# Altium integrated library Integrated_Library - 02.02.25 - 22.49.IntLib: 792 symbols (part 9 of 11) (continued)
## CMP-020-00005-3 (continued)
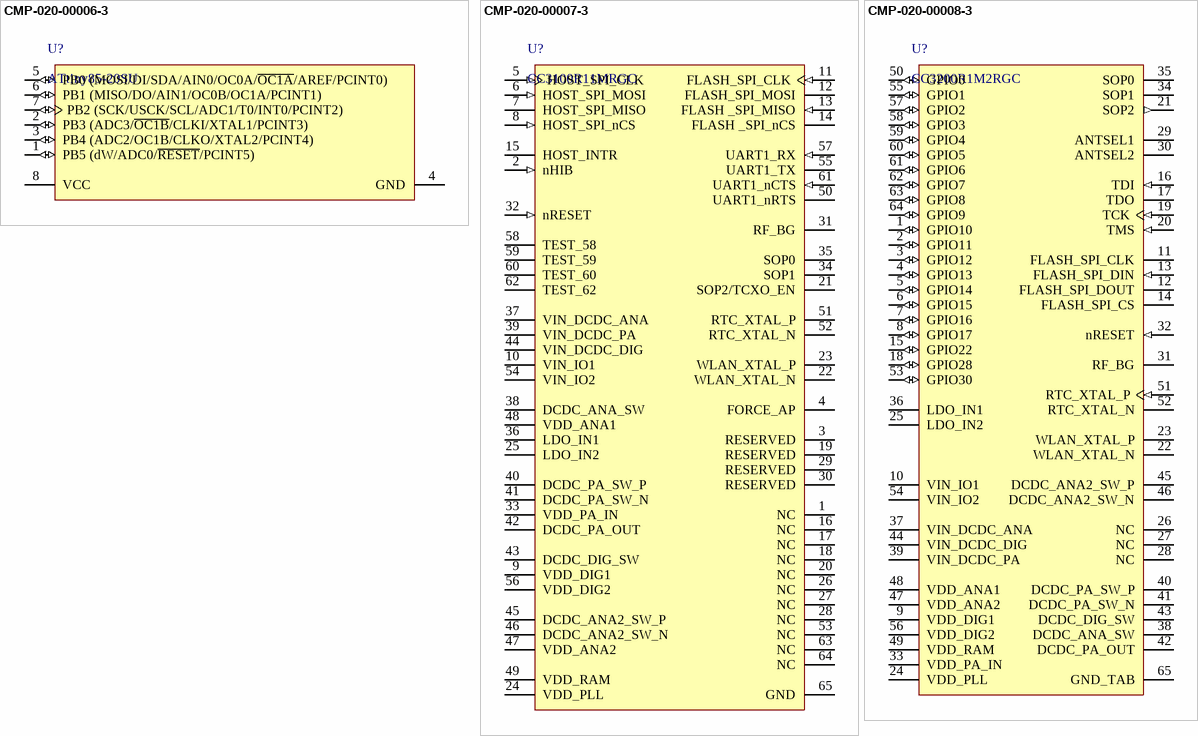
[diagram p21: symbols CMP-020-00006-3 to CMP-020-00008-3]

## CMP-020-00006-3
designator U?, comment ATtiny85-20SU
8-bit AVR Microcontroller with In-System Programmable Flash, 2.7 to 5.5 V, 20 MHz, 8 KB Flash, 0.5 KB EEPROM, 0.5 KB SRAM, -40 to 85 degC, 8-Pin SOIC (8S2), RoHS, Tube; Manufacturer: Atmel; ADC Channels: 4; Max Supply Voltage: 5.5V; PWM Channels: 6; UART Channels: 1; Interface: SPI; USB Channels: 0; Min Supply Voltage: 2.7V; Frequency: 20MHz; RAM Size: 512B; Density: 8KB; Datasheet Version: Rev. 2586Q, 08/2013; Package Quantity: 95; RoHS Compliant: True; Manufacturer URL: http://www.atmel.com/; Datasheet URL: http://www.atmel.com/Images/Atmel-2586-AVR-8-bit-Microcontroller-ATtiny25-ATtiny45-ATtiny85_Datasheet.pdf; Package Description: 8-Pin Small Outline Integrated Circuit Package, Body 5.29 x 5.24 mm, Pitch 1.27 mm; Mounting Technology: SM; Max Operating Temperature: 85°C; Case/Package: SOIC; I/Os: 6; Max Clock Frequency: 20MHz; Packaging: Rail/Tube; Min Operating Temperature: -40°C; Pins: 8; Package Reference: 8S2
footprint ATML-8S2_N (SOIC, 8-Leads, Body 5.4x5.4mm, Pitch 1.27mm, IPC Medium Density)
footprint ATML-8S2_M (SOIC, 8-Leads, Body 5.4x5.4mm, Pitch 1.27mm, IPC Low Density)
footprint ATML-8S2_L (SOIC, 8-Leads, Body 5.4x5.4mm, Pitch 1.27mm, IPC High Density)
pins: 1 PB5 (dW/ADC0/~{RESET}/PCINT5) (io), 2 PB3 (ADC3/~{OC1B}/CLKI/XTAL1/PCINT3) (io), 3 PB4 (ADC2/OC1B/CLKO/XTAL2/PCINT4) (io), 4 GND (power) "Ground.", 5 PB0 (MOSI/DI/SDA/AIN0/OC0A/~{OC1A}/AREF/PCINT0) (io), 6 PB1 (MISO/DO/AIN1/OC0B/OC1A/PCINT1) (io), 7 PB2 (SCK/USCK/SCL/ADC1/T0/INT0/PCINT2) (io), 8 VCC (power) "Supply voltage."

## CMP-020-00007-3
designator U?, comment CC3100R11MRGC
SimpleLink(TM) Wi-Fi(R) Network Processor, Internet-of-Things Solution for MCU Application, 2.1 to 3.6 V, -40 to 85 degC, 64-Pin VQFN (RGC), Green (RoHS & no Sb/Br), Tray; Manufacturer: Texas Instruments; Max Supply Voltage: 3.6V; Min Supply Voltage: 2.1V; RoHS Compliant: True; Datasheet URL: http://www.ti.com/lit/ds/symlink/cc3100.pdf; Datasheet Version: SWAS031D, 02/2015; Packaging: CutTape; Pins: 64; Case/Package: RGC0064H; Mounting Technology: SM; Package Reference: RGC0064H; Min Operating Temperature: -40°C; Package Description: 64-Pin Quad Flat No-lead Package, Body 9 x 9 mm, Pitch 0.5 mm, Thermal Pad 7.3 x7.3 mm; Max Operating Temperature: 85°C; Manufacturer URL: http://www.ti.com/
footprint RGC0064H_V (QFN, 64-Leads, Body 9x9mm, Pitch 0.5mm, Thermal Pad 7.4x7.4mm, TI Recommend)
pins: 1 NC "Unused; leave unconnected.", 2 nHIB (in) "Hibernate signal input to the NWP (active low). This is connected to the MCU GPIO. If the GPIO from the MCU can float while the MCU enters low power, consider adding a pull-up resistor on the board to avoid floating.", 3 RESERVED "Reserved for future use", 4 FORCE_AP "For forced AP mode, pull to high on the board using 100k resistor. Otherwise, pull down to ground using 100k resistor.(1)", 5 HOST_SPI_CLK (in) "Host interface SPI clock", 6 HOST_SPI_MOSI (in) "Host interface SPI data input", 7 HOST_SPI_MISO "Host interface SPI data output", 8 HOST_SPI_nCS (in) "Host interface SPI chip selec", 9 VDD_DIG1 (power) "Digital core supply", 10 VIN_IO1 (power) "I/O supply", 11 FLASH_SPI_CLK (in) "Serial flash interface: SPI clock", 12 FLASH_SPI_MOSI "Serial flash interface: SPI data out", 13 FLASH _SPI_MISO (in) "Serial flash interface: SPI data in", 14 FLASH _SPI_nCS "Serial flash interface: SPI chip select (active low)", 15 HOST_INTR (hiz) "Interrupt output (active high)", 16 NC "Unused; leave unconnected.", 17 NC "Unused; leave unconnected.", 18 NC "Unused; leave unconnected.", 19 RESERVED "Connect 100K pull-down to ground.", 20 NC "Unused; leave unconnected.", 21 SOP2/TCXO_EN "Enable signal for external TCXO. Add 10k pulldown to ground.", 22 WLAN_XTAL_N "Connect the WLAN 40-MHz XTAL here.", 23 WLAN_XTAL_P "Connect the WLAN 40-MHz XTAL here.", 24 VDD_PLL (power) "Internal PLL power supply (1.4 V nominal)", 25 LDO_IN2 (power) "Input to internal LDO", 26 NC "Unused; leave unconnected.", 27 NC "Unused; leave unconnected.", 28 NC "Unused; leave unconnected.", 29 RESERVED "Reserved for future use", 30 RESERVED "Reserved for future use", 31 RF_BG "2.4-GHz RF TX/RX", 32 nRESET (in) "RESET input for the device. Active low input. Use RC circuit (100k || 0.1 uF) for power on reset.", 33 VDD_PA_IN (power) "Power supply for the RF power amplifier (PA)", 34 SOP1 "Add 100K pulldown to ground.", 35 SOP0 "Add 100K pulldown to ground.", 36 LDO_IN1 (power) "Input to internal LDO", 37 VIN_DCDC_ANA (power) "Power supply for the DC-DC converter for analog section", 38 DCDC_ANA_SW (power) "Analog DC-DC converter switch output", 39 VIN_DCDC_PA (power) "PA DC-DC converter input supply", 40 DCDC_PA_SW_P (power) "PA DC-DC converter switch output +ve", 41 DCDC_PA_SW_N (power) "PA DC-DC converter switch output -ve", 42 DCDC_PA_OUT (power) "PA DC-DC converter output. Connect the output capacitor for DC-DC here.", 43 DCDC_DIG_SW (power) "Digital DC-DC converter switch output", 44 VIN_DCDC_DIG (power) "Power supply input for the digital DC-DC converter", 45 DCDC_ANA2_SW_P (power) "Analog2 DC-DC converter switch output +ve", 46 DCDC_ANA2_SW_N (power) "Analog2 DC-DC converter switch output -ve", 47 VDD_ANA2 (power) "Analog2 power supply input", 48 VDD_ANA1 (power) "Analog1 power supply input", 49 VDD_RAM (power) "Power supply for the internal RAM", 50 UART1_nRTS "UART host interface", 51 RTC_XTAL_P "32.768 kHz XTAL_P/external CMOS level clock input", 52 RTC_XTAL_N "32.768 kHz XTAL_N/100k external pullup for external clock", 53 NC "Unused. Leave unconnected.", 54 VIN_IO2 (power) "I/O power supply. Same as battery voltage.", 55 UART1_TX "UART host interface. Connect to test point on prototype for flash programming.", 56 VDD_DIG2 (power) "Digital power supply (1.2 V)", 57 UART1_RX (in) "UART host interface. Connect to test point on prototype for flash programming.", 58 TEST_58 "Test signal. Connect to an external test point", 59 TEST_59 "Test signal. Connect to an external test point.", 60 TEST_60 "Test signal. Connect to an external test point.", 61 UART1_nCTS (in) "UART host interface", 62 TEST_62 "Test signal. Connect to an external test point.", 63 NC "Leave unconnected", 64 NC "Leave unconnected", 65 GND (power) "Ground tab used as thermal and electrical ground"

## CMP-020-00008-3
designator U?, comment CC3200R1M2RGC
SimpleLink Wi-Fi and Internet-of-Things Solution, A Single-Chip Wireless MCU, 2.1 to 3.6 V, -40 to 85 degC, 64-Pin PQFN (RGC64), Green (RoHS & no Sb/Br), Tray; Manufacturer: Texas Instruments; RAM Size: 256KB; Min Operating Temperature: -40°C; Manufacturer URL: http://www.ti.com/; RoHS Compliant: True; Datasheet URL: http://www.ti.com/lit/ds/symlink/cc3200.pdf; Max Operating Temperature: 85°C; Package URL: http://www.ti.com/lit/ml/mpqf125e/mpqf125e.pdf; Case/Package: RGC64; Package Reference: RGC64; Datasheet Version: SWAS032F, 02/2015; Packaging: Tray
footprint TI-RGC64-7300x7300TP_L (QFN, 64-Leads, Body 9.15x9.15mm, Pitch 0.50mm, Thermal Pad 7.30x7.30mm, IPC High Density)
footprint TI-RGC64-7300x7300TP_M (QFN, 64-Leads, Body 9.15x9.15mm, Pitch 0.50mm, Thermal Pad 7.30x7.30mm, IPC Low Density)
footprint TI-RGC64-7300x7300TP_N (QFN, 64-Leads, Body 9.15x9.15mm, Pitch 0.50mm, Thermal Pad 7.30x7.30mm, IPC Medium Density)
pins: 1 GPIO10 (io) "General-Purpose  I/O", 2 GPIO11 (io) "General-Purpose  I/O", 3 GPIO12 (io) "General Purpose  I/O", 4 GPIO13 (io) "General Purpose  I/O", 5 GPIO14 (io) "General Purpose  I/O", 6 GPIO15 (io) "General Purpose  I/O", 7 GPIO16 (io) "General Purpose  I/O", 8 GPIO17 (io) "General Purpose  I/O", 9 VDD_DIG1 (power) "Internal Digital Core Voltage", 10 VIN_IO1 (power) "Chip Supply  Voltage (VBAT)", 11 FLASH_SPI_CLK (hiz) "Clock To SPI  Serial Flash  (Fixed Default)", 12 FLASH_SPI_DOUT (hiz) "Data To SPI  Serial Flash  (Fixed Default)", 13 FLASH_SPI_DIN (in) "Data From SPI  Serial Flash  (Fixed Default)", 14 FLASH_SPI_CS (hiz) "Chip Select To  SPI Serial Flash  (Fixed Default)", 15 GPIO22 (io) "General Purpose  I/O", 16 TDI (in) "JTAG TDI. Reset  Default Pinout.", 17 TDO (hiz) "JTAG TDO.  Reset Default  Pinout.", 18 GPIO28 (io) "General Purpose  I/O", 19 TCK (in) "JTAG/SWD TCK  Reset Default  Pinout", 20 TMS (in) "JATG/SWD TMS  Reset Default  Pinout", 21 SOP2 (out) "Sense-On-Power  2", 22 WLAN_XTAL_N "40-MHz XTAL  Pulldown if ext TCXO is used.", 23 WLAN_XTAL_P "40-MHz XTAL or  TCXO clock input", 24 VDD_PLL (power) "Internal analog voltage", 25 LDO_IN2 (power) "Analog RF  supply from ANA  DC-DC output", 26 NC "Reserved", 27 NC "Reserved", 28 NC "Reserved", 29 ANTSEL1 (hiz) "Antenna  Selection Control", 30 ANTSEL2 (hiz) "Antenna  Selection Control", 31 RF_BG "RF BG band", 32 nRESET (in) "Master chip  reset. Active low.", 33 VDD_PA_IN (power) "PA supply  voltage from PA  DC-DC output.", 34 SOP1 "Sense On Power  1", 35 SOP0 "Sense On Power  0", 36 LDO_IN1 (power) "Analog RF  supply from ana DC-DC output", 37 VIN_DCDC_ANA (power) "Analog DC-DC  input (connected  to chip input  supply [VBAT])", 38 DCDC_ANA_SW (power) "Analog DC-DC  switching node.", 39 VIN_DCDC_PA (power) "PA DC-DC input  (connected to  chip input supply  [VBAT])", 40 DCDC_PA_SW_P (power) "PA DCDC  switching node", 41 DCDC_PA_SW_N (power) "PA DCDC  switching node", 42 DCDC_PA_OUT (power) "PA buck  converter output", 43 DCDC_DIG_SW (power) "DIG DC-DC  switching node", 44 VIN_DCDC_DIG (power) "DIG DC-DC input  (connected to  chip input supply  [VBAT])", 45 DCDC_ANA2_SW_P "ANA2 DCDC  Converter +ve  Switching Node.", 46 DCDC_ANA2_SW_N "ANA2 DCDC  Converter -ve Switching Node.", 47 VDD_ANA2 (power) "ANA2 DCDC O", 48 VDD_ANA1 (power) "Analog supply  fed by ANA2 DCDC output", 49 VDD_RAM (power) "SRAM LDO  output", 50 GPIO0 (io) "General-Purpose  I/O", 51 RTC_XTAL_P (in) "Connect 32.768-  kHz XTAL or  Froce external CMOS level  clock", 52 RTC_XTAL_N "Connect 32.768-  kHz XTAL or connect a 100 kohm  to Vsupply.", 53 GPIO30 (io) "General-Purpose  I/O", 54 VIN_IO2 (power) "Chip Supply  Voltage (VBAT)", 55 GPIO1 (io) "General-Purpose  I/O", 56 VDD_DIG2 (power) "Internal Digital  Core Voltage", 57 GPIO2 (io) "General-Purpose  I/O", 58 GPIO3 (io) "General-Purpose  I/O", 59 GPIO4 (io) "General-Purpose  I/O", 60 GPIO5 (io) "General-Purpose  I/O", 61 GPIO6 (io) "General-Purpose  I/O", 62 GPIO7 (io) "General-Purpose  I/O", 63 GPIO8 (io) "General-Purpose  I/O", 64 GPIO9 (io) "General-Purpose  I/O", 65 GND_TAB (power) "Thermal pad and  electrical ground"

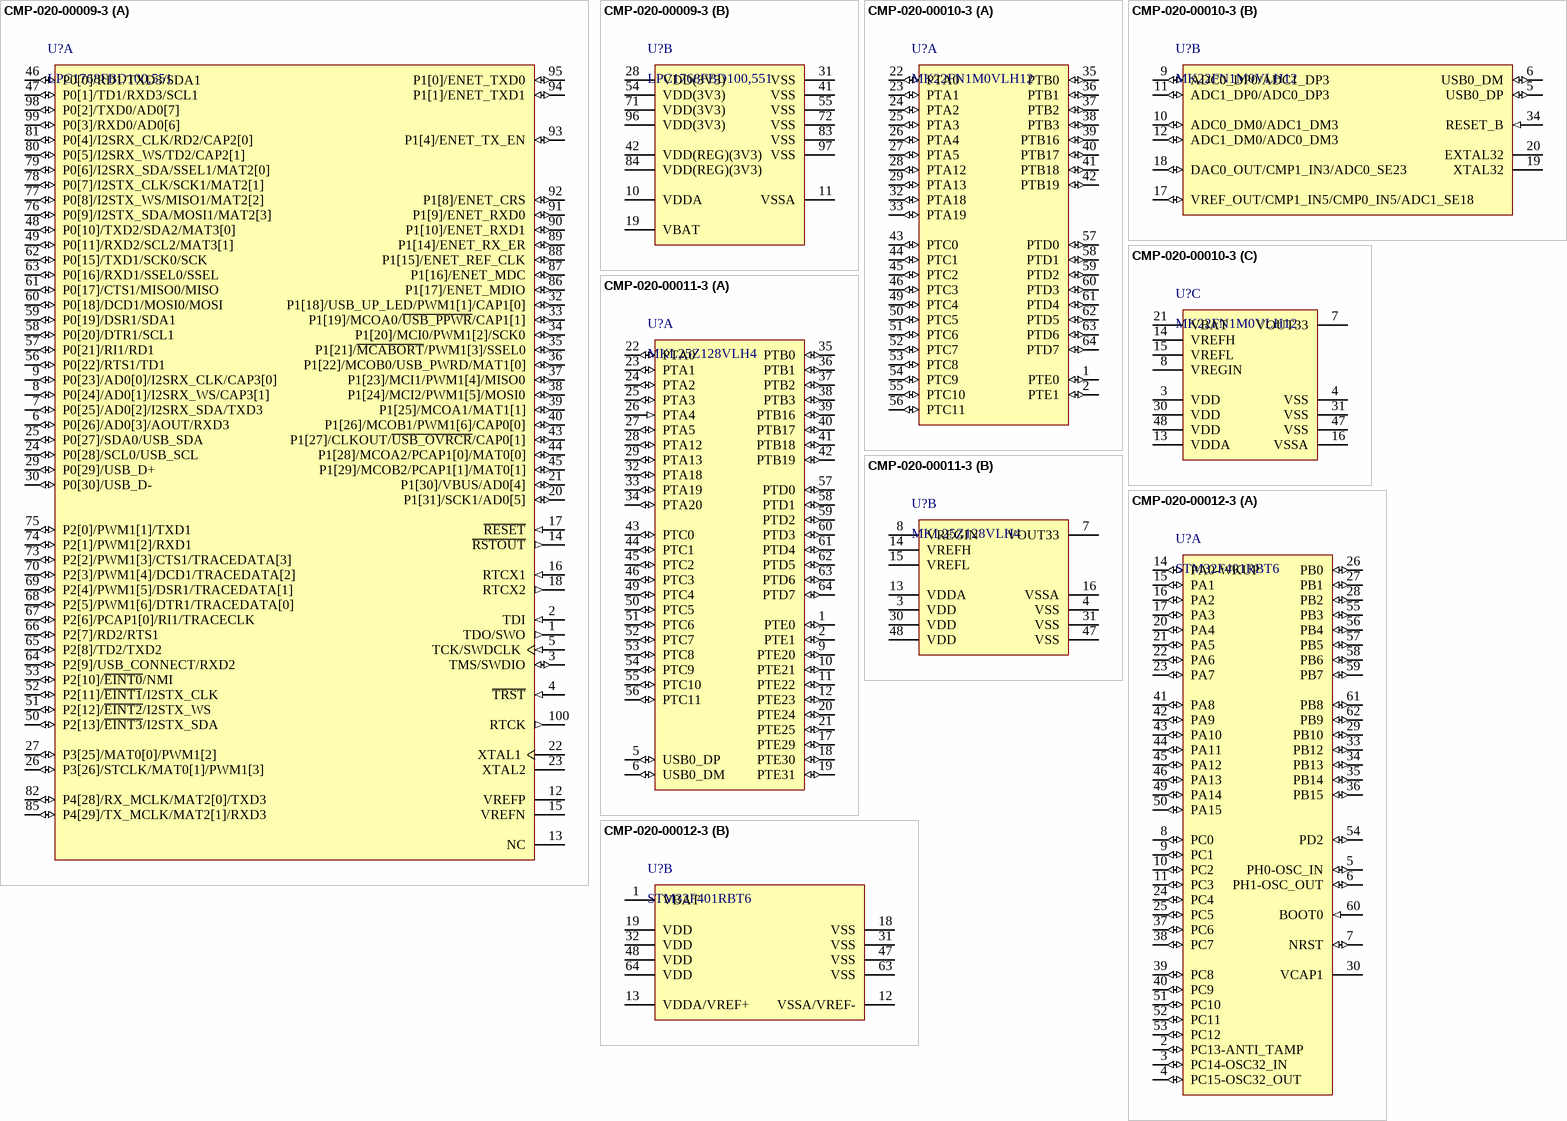
[diagram p22: symbols CMP-020-00009-3 to CMP-020-00012-3]

## CMP-020-00009-3
designator U?, comment LPC1768FBD100,551
32-Bit ARM Cortex-M3 Microcontroller, Ethernet, USB 2.0 Host/Device/OTG, CAN, 512 KB Flash, 64 KB SRAM, -40 to 85 degC, 100-Pin LQFP (SOT407-1), RoHS, Tray; Manufacturer: NXP; Density: 512KB; PWM Channels: 7; I/Os: 70; Frequency: 100MHz; Power: 1.5W; RAM Size: 64KB; Min Supply Voltage: 2.4V; UART Channels: 4; Max Supply Voltage: 3.6V; Nominal Supply Voltage: 3.3V; ADC Channels: 8; Ethernet Channels: 1; Interface: UART; Package Reference: SOT407-1; Datasheet URL: http://www.nxp.com/documents/data_sheet/LPC1769_68_67_66_65_64_63.pdf; Case/Package: LQFP; RoHS Compliant: True; Package Quantity: 90; Max Clock Frequency: 100MHz; Package URL: http://www.nxp.com/documents/; Pins: 100; Package Description: 100-Pin Plastic Low Profile Quad Flat Package, Body 14 x 14 mm; Mounting Technology: SM; Datasheet Version: Rev. 9.6 , 08/2015; Manufacturer URL: http://www.nxp.com/; Min Operating Temperature: -40°C; Max Operating Temperature: 85°C; Packaging: Tray
footprint NXP-SOT407-1_V (QFP, 100-Leads, Body 14x14mm)
part A pins: 1 TDO/SWO (out), 2 TDI (in), 3 TMS/SWDIO (io), 4 ~{TRST} (in), 5 TCK/SWDCLK (in), 6 P0[26]/AD0[3]/AOUT/RXD3 (io), 7 P0[25]/AD0[2]/I2SRX_SDA/TXD3 (io), 8 P0[24]/AD0[1]/I2SRX_WS/CAP3[1] (io), 9 P0[23]/AD0[0]/I2SRX_CLK/CAP3[0] (io), 12 VREFP, 13 NC, 14 ~{RSTOUT} (out), 15 VREFN, 16 RTCX1 (in), 17 ~{RESET} (in), 18 RTCX2 (out), 20 P1[31]/SCK1/AD0[5] (io), 21 P1[30]/VBUS/AD0[4] (io), 22 XTAL1, 23 XTAL2, 24 P0[28]/SCL0/USB_SCL (io), 25 P0[27]/SDA0/USB_SDA (io), 26 P3[26]/STCLK/MAT0[1]/PWM1[3] (io), 27 P3[25]/MAT0[0]/PWM1[2] (io), 29 P0[29]/USB_D+ (io), 30 P0[30]/USB_D- (io), 32 P1[18]/USB_UP_LED/PWM1[1]/CAP1[0] (io), 33 P1[19]/MCOA0/~{USB_PPWR}/CAP1[1] (io), 34 P1[20]/MCI0/PWM1[2]/SCK0 (io), 35 P1[21]/~{MCABORT}/PWM1[3]/SSEL0 (io), 36 P1[22]/MCOB0/USB_PWRD/MAT1[0] (io), 37 P1[23]/MCI1/PWM1[4]/MISO0 (io), 38 P1[24]/MCI2/PWM1[5]/MOSI0 (io), 39 P1[25]/MCOA1/MAT1[1] (io), 40 P1[26]/MCOB1/PWM1[6]/CAP0[0] (io), 43 P1[27]/CLKOUT/~{USB_OVRCR}/CAP0[1] (io), 44 P1[28]/MCOA2/PCAP1[0]/MAT0[0] (io), 45 P1[29]/MCOB2/PCAP1[1]/MAT0[1] (io), 46 P0[0]/RD1/TXD3/SDA1 (io), 47 P0[1]/TD1/RXD3/SCL1 (io), 48 P0[10]/TXD2/SDA2/MAT3[0] (io), 49 P0[11]/RXD2/SCL2/MAT3[1] (io), 50 P2[13]/~{EINT3}/I2STX_SDA (io), 51 P2[12]/~{EINT2}/I2STX_WS (io), 52 P2[11]/~{EINT1}/I2STX_CLK (io), 53 P2[10]/~{EINT0}/NMI (io), 56 P0[22]/RTS1/TD1 (io), 57 P0[21]/RI1/RD1 (io), 58 P0[20]/DTR1/SCL1 (io), 59 P0[19]/DSR1/SDA1 (io), 60 P0[18]/DCD1/MOSI0/MOSI (io), 61 P0[17]/CTS1/MISO0/MISO (io), 62 P0[15]/TXD1/SCK0/SCK (io), 63 P0[16]/RXD1/SSEL0/SSEL (io), 64 P2[9]/USB_CONNECT/RXD2 (io), 65 P2[8]/TD2/TXD2 (io), 66 P2[7]/RD2/RTS1 (io), 67 P2[6]/PCAP1[0]/RI1/TRACECLK (io), 68 P2[5]/PWM1[6]/DTR1/TRACEDATA[0] (io), 69 P2[4]/PWM1[5]/DSR1/TRACEDATA[1] (io), 70 P2[3]/PWM1[4]/DCD1/TRACEDATA[2] (io), 73 P2[2]/PWM1[3]/CTS1/TRACEDATA[3] (io), 74 P2[1]/PWM1[2]/RXD1 (io), 75 P2[0]/PWM1[1]/TXD1 (io), 76 P0[9]/I2STX_SDA/MOSI1/MAT2[3] (io), 77 P0[8]/I2STX_WS/MISO1/MAT2[2] (io), 78 P0[7]/I2STX_CLK/SCK1/MAT2[1] (io), 79 P0[6]/I2SRX_SDA/SSEL1/MAT2[0] (io), 80 P0[5]/I2SRX_WS/TD2/CAP2[1] (io), 81 P0[4]/I2SRX_CLK/RD2/CAP2[0] (io), 82 P4[28]/RX_MCLK/MAT2[0]/TXD3 (io), 85 P4[29]/TX_MCLK/MAT2[1]/RXD3 (io), 86 P1[17]/ENET_MDIO (io), 87 P1[16]/ENET_MDC (io), 88 P1[15]/ENET_REF_CLK (io), 89 P1[14]/ENET_RX_ER (io), 90 P1[10]/ENET_RXD1 (io), 91 P1[9]/ENET_RXD0 (io), 92 P1[8]/ENET_CRS (io), 93 P1[4]/ENET_TX_EN (io), 94 P1[1]/ENET_TXD1 (io), 95 P1[0]/ENET_TXD0 (io), 98 P0[2]/TXD0/AD0[7] (io), 99 P0[3]/RXD0/AD0[6] (io), 100 RTCK (out)
part B pins: 10 VDDA (power), 11 VSSA (power), 19 VBAT (power), 28 VDD(3V3) (power), 31 VSS (power), 41 VSS (power), 42 VDD(REG)(3V3) (power), 54 VDD(3V3) (power), 55 VSS (power), 71 VDD(3V3) (power), 72 VSS (power), 83 VSS (power), 84 VDD(REG)(3V3) (power), 96 VDD(3V3) (power), 97 VSS (power)

## CMP-020-00010-3
designator U?, comment MK22FN1M0VLH12
Kinetis K22F Sub-Family, 120 MHz ARM(R) Cortex(R)-M4-based Microcontroller with FPU, 1.71 to 3.6 V, -40 to 105 degC, 64-Pin LQFP, RoHS, Tray; Manufacturer: Freescale; Max Supply Voltage: 3.6V; Density: 1MB; Package Version: Rev. G, 01/2016; RAM Size: 128KB; Max Clock Frequency: 120MHz; Interface: UART; Min Supply Voltage: 1.71V; Datasheet Version: Rev. 4, 11/2014; Package Quantity: 160; Package Reference: LQFP-64; Package Description: 64-Pin Low-profile Quad Flat Package, Body 10 x 10 mm, Pitch 0.5 mm; Mounting Technology: SM; Max Operating Temperature: 105°C; Datasheet URL: http://cache.nxp.com/files/32bit/doc/data_sheet/K22P64M120SF5.pdf; Min Operating Temperature: -40°C; RoHS Compliant: True; Case/Package: LQFP; Packaging: Tray; Package URL: http://cache.nxp.com/files/shared/doc/package_info/98ASS23234W.pdf?fsrch=1&sr=1&pageNum=1; Manufacturer URL: http://www.nxp.com/; Pins: 64
footprint FREE-LQFP-64_L (TSQFP, 64-Leads, Body 10.00x10.00mm, Pitch 0.50mm, IPC High Density)
footprint FREE-LQFP-64_N (TSQFP, 64-Leads, Body 10.00x10.00mm, Pitch 0.50mm, IPC Medium Density)
footprint FREE-LQFP-64_M (TSQFP, 64-Leads, Body 10.00x10.00mm, Pitch 0.50mm, IPC Low Density)
part A pins: 1 PTE0 (io) "ADC1_SE4A/UART1_TX/TRACE_CLKOUT/I2C1_SDA/RTC_CLKOUT", 2 PTE1 (io) "LLWU_P0/ADC1_SE5A/UART1_RX/TRACE_D3/I2C1_SCL", 22 PTA0 (io) "UART0_CTS_B/FTM0_CH5/JTAG_TCLK/SWD_CLK/EZP_CLK", 23 PTA1 (io) "UART0_RX/FTM0_CH6/JTAG_TDI/EZP_DI", 24 PTA2 (io) "UART0_TX/FTM0_CH7/JTAG_TDO/TRACE_SWO/EZP_DO", 25 PTA3 (io) "UART0_RTS_B/FTM0_CH0/JTAG_TMS/SWD_DIO", 26 PTA4 (io) "LLWU_P3/FTM0_CH1/NMI_B/EZP_CS_B", 27 PTA5 (io) "USB_CLKIN/FTM0_CH2/CMP2_OUT/2S0_TX_BCLK/JTAG_TRST_B", 28 PTA12 (io) "CMP2_IN0/CAN0_TX/FTM1_CH0/I2C2_SCL/I2S0_TXD0/FTM1_QD_PHA", 29 PTA13 (io) "LLWU_P4/CMP2_IN1/CAN0_RX/FTM1_CH1/I2C2_SDA/I2S0_TX_FS/FTM1_QD_PHB", 32 PTA18 (io) "EXTAL0/FTM0_FLT2/FTM_CLKIN0", 33 PTA19 (io) "XTAL0/FTM1_FLT0/FTM_CLKIN1/LPTMR0_ALT1", 35 PTB0 (io) "LLWU_P5/ADC0_SE8/ADC1_SE8/I2C0_SCL/FTM1_CH0/FTM1_QD_PHA", 36 PTB1 (io) "ADC0_SE9/ADC1_SE9/PTB1/I2C0_SDA/FTM1_CH1/FTM1_QD_PHB", 37 PTB2 (io) "ADC0_SE12/I2C0_SCL/UART0_RTS_B/FTM0_FLT3", 38 PTB3 (io) "ADC0_SE13/I2C0_SDA/UART0_CTS_B/FTM0_FLT0", 39 PTB16 (io) "UART0_RX/FTM_CLKIN0/FB_AD17/EWM_IN", 40 PTB17 (io) "UART0_TX/FTM_CLKIN1/FB_AD16/EWM_OUT_B", 41 PTB18 (io) "CAN0_TX/FTM2_CH0/I2S0_TX_BCLK/FB_AD15/FTM2_QD_PHA", 42 PTB19 (io) "CAN0_RX/FTM2_CH1/I2S0_TX_FS/FB_OE_B/FTM2_QD_PHB", 43 PTC0 (io) "ADC0_SE14/SPI0_PCS4/PDB0_EXTRG/FB_AD14/I2S0_TXD1", 44 PTC1 (io) "LLWU_P6/ADC0_SE15/SPI0_PCS3/UART1_RTS_B/ FTM0_CH0/FB_AD13/I2S0_TXD0", 45 PTC2 (io) "ADC0_SE4B/CMP1_IN0/SPI0_PCS2/UART1_CTS_B/FTM0_CH1/FB_AD12/I2S0_TX_FS", 46 PTC3 (io) "LLWU_P7/CMP1_IN1/SPI0_PCS1/UART1_RX/FTM0_CH2/CLKOUT/I2S0_TX_BCLK", 49 PTC4 (io) "LLWU_P8/SPI0_PCS0/UART1_TX/FTM0_CH3/FB_AD11/CMP1_OUT", 50 PTC5 (io) "LLWU_P9/SPI0_SCK/LPTMR0_ALT2/I2S0_RXD0/FB_AD10/CMP0_OUT/FTM0_CH2", 51 PTC6 (io) "LLWU_P10/CMP0_IN0/SPI0_SOUT/PDB0_EXTRG/I2S0_RX_BCLK/FB_AD9/I2S0_MCLK", 52 PTC7 (io) "CMP0_IN1/SPI0_SIN/USB_SOF_OUT/I2S0_RX_FS/FB_AD8", 53 PTC8 (io) "ADC1_SE4B/CMP0_IN2/FTM3_CH4/I2S0_MCLK/FB_AD7", 54 PTC9 (io) "ADC1_SE5B/CMP0_IN3/FTM3_CH5/I2S0_RX_BCLK/FB_AD6/FTM2_FLT0", 55 PTC10 (io) "ADC1_SE6B/I2C1_SCL/FTM3_CH6/I2S0_RX_FS/FB_AD5", 56 PTC11 (io) "LLWU_P11/ADC1_SE7B/I2C1_SDA/FTM3_CH7/I2S0_RXD1/FB_RW_B", 57 PTD0 (io) "LLWU_P12/SPI0_PCS0/UART2_RTS_B/FTM3_CH0/FB_ALE/FB_CS1_B/FB_TS_B", 58 PTD1 (io) "ADC0_SE5B/SPI0_SCK/UART2_CTS_B/FTM3_CH1/FB_CS0_B", 59 PTD2 (io) "LLWU_P13/SPI0_SOUT/UART2_RX/FTM3_CH2/FB_AD4/I2C0_SCL", 60 PTD3 (io) "SPI0_SIN/UART2_TX/FTM3_CH3/FB_AD3/I2C0_SDA", 61 PTD4 (io) "LLWU_P14/SPI0_PCS1/UART0_RTS_B/FTM0_CH4/FB_AD2/EWM_IN", 62 PTD5 (io) "ADC0_SE6B/SPI0_PCS2/UART0_CTS_ B/FTM0_CH5/FB_AD1/EWM_OUT_B", 63 PTD6 (io) "LLWU_P15/ADC0_SE7B/SPI0_PCS3/UART0_RX/FTM0_CH6/FB_AD0/FTM0_FLT0", 64 PTD7 (io) "CMT_IRO/UART0_TX/FTM0_CH7/FTM0_FLT1"
part B pins: 5 USB0_DP (io), 6 USB0_DM (io), 9 ADC0_DP0/ADC1_DP3 (io), 10 ADC0_DM0/ADC1_DM3 (io), 11 ADC1_DP0/ADC0_DP3 (io), 12 ADC1_DM0/ADC0_DM3 (io), 17 VREF_OUT/CMP1_IN5/CMP0_IN5/ADC1_SE18 (io), 18 DAC0_OUT/CMP1_IN3/ADC0_SE23 (io), 19 XTAL32, 20 EXTAL32, 34 RESET_B (in)
part C pins: 3 VDD (power) "Digital supply voltage", 4 VSS (power), 7 VOUT33 (power), 8 VREGIN (power) "Input supply voltage", 13 VDDA (power) "Analog supply voltage", 14 VREFH (power) "ADC reference  voltage high", 15 VREFL (power) "ADC reference  voltage low", 16 VSSA (power), 21 VBAT (power) "RTC battery supply voltage", 30 VDD (power) "Digital supply voltage", 31 VSS (power), 47 VSS (power), 48 VDD (power) "Digital supply voltage"

## CMP-020-00011-3
designator U?, comment MKL25Z128VLH4
48 MHz Cortex-M0+ Based Microcontroller with USB, 1.71 to 3.6 V, -40 to 105 degC, 64-Pin LQFP, RoHS, Tray; Manufacturer: Freescale; I/Os: 50; Package Version: Rev. G, 01/2016; Frequency: 48MHz; Max Supply Voltage: 3.6V; Density: 128KB; ADC Channels: 14; Min Supply Voltage: 1.71V; PWM Channels: 6; Interface: UART; RAM Size: 16KB; Package Description: 64-Pin Low-profile Quad Flat Package, Body 10 x 10 mm, Pitch 0.5 mm; Package Quantity: 160; RoHS Compliant: True; Package Reference: LQFP-64; Min Operating Temperature: -40°C; Package URL: http://cache.nxp.com/files/shared/doc/package_info/98ASS23234W.pdf?fsrch=1&sr=1&pageNum=1; Packaging: Tray; Max Operating Temperature: 105°C; Pins: 64; Max Clock Frequency: 48MHz; Manufacturer URL: http://www.nxp.com/; Case/Package: LQFP; Datasheet URL: http://cache.freescale.com/files/32bit/doc/data_sheet/KL25P80M48SF0.pdf; Datasheet Version: Rev. 5, 08/2014; Mounting Technology: SM
footprint FREE-LQFP-64_L (TSQFP, 64-Leads, Body 10.00x10.00mm, Pitch 0.50mm, IPC High Density)
footprint FREE-LQFP-64_N (TSQFP, 64-Leads, Body 10.00x10.00mm, Pitch 0.50mm, IPC Medium Density)
footprint FREE-LQFP-64_M (TSQFP, 64-Leads, Body 10.00x10.00mm, Pitch 0.50mm, IPC Low Density)
part A pins: 1 PTE0 (io) "UART1_TX/RTC_CLKOUT/CMP0_OUT/I2C1_SDA", 2 PTE1 (io) "SPI1_MOSI/UART1_RX/SPI1_MISO/I2C1_SCL", 5 USB0_DP (io), 6 USB0_DM (io), 9 PTE20 (io) "ADC0_DP0/ADC0_SE0/TPM1_CH0/UART_TX", 10 PTE21 (io) "ADC0_DM0/ADC_SE4A/TPM1_CH1/UART0_RX", 11 PTE22 (io) "ADC0_DP3/ADC0_SE3/TPM2_CH0/UART2_TX", 12 PTE23 (io) "ADC0_DP3/ADC0_SE7A/TPM2_CH1/UART_RX", 17 PTE29 (io) "CMP0_IN5/ADC0_SE4B/TPM0_CH2/TPM_CLKIN0", 18 PTE30 (io) "DAC0_OUT/ADC0_SE23/CMP0_IN4/TPM0_CH3/TPM_CLKIN1", 19 PTE31 (io) "TPM0_CH4", 20 PTE24 (io) "TPM0_CH0/I2C0_SCL", 21 PTE25 (io) "TPM0_CH1/I2C0_SDA", 22 PTA0 (io) "TSI0_CH1/TPM0_CH5/SWD_CLK", 23 PTA1 (io) "TSI0_CH2/UART0_RX/TPM2_CH0", 24 PTA2 (io) "TSI0_CH3/UART0_TX/TPM2_CH1", 25 PTA3 (io) "TSI0_CH4/I2C1_SCL/TPM0_CH0/SWD_DIO", 26 PTA4 (in) "TSI0_CH5/I2C1_SDA/TPM0_CH1/NMI_B", 27 PTA5 (io) "USB_CLKIN/TPM0_CH2", 28 PTA12 (io) "TPM1_CH0", 29 PTA13 (io) "TPM1_CH1", 32 PTA18 (io) "EXTAL0/UART1_RX/TPM_CLKIN0", 33 PTA19 (io) "XTAL0/UART1_TX/TPM_CLKIN1/LPTMR0_ALT1", 34 PTA20 (io) "RESET_B", 35 PTB0 (io) "LLWU_P5/ADC0_SE8/TSI0_CH0/I2C0_SCL/TPM1_CH0", 36 PTB1 (io) "ADC0_SE9/TSI0_CH6/I2C0_SDA/TPM1_CH1", 37 PTB2 (io) "ADC0_SE12/TSI0_CH7/I2C0_SCL/TPM2_CH0", 38 PTB3 (io) "ADC0_SE13/TSI0_CH8/I2C0_SDA/TPM2_CH1", 39 PTB16 (io) "TSI0_CH9/SPI1_MOSI/UART0_RX/TPM_CLKIN0/SPI1_MISO", 40 PTB17 (io) "TSI0_CH10/SPI1_MISO/UART0_TX/TPM_CLKIN1/SPI1_MOSI", 41 PTB18 (io) "TSI0_CH11/TPM2_CH0", 42 PTB19 (io) "TSI0_CH12/TPM2_CH1", 43 PTC0 (io) "ADC0_SE14/TSI0_CH13/EXTRG_IN/CMP0_OUT", 44 PTC1 (io) "LLWU_P6/RTC_CLKIN/ADC0_SE15/TSI0_CH14/I2C1_SCL/TPM0_CH0", 45 PTC2 (io) "ADC0_SE11/TSI0_CH15/I2C1_SDA/TPM0_CH1", 46 PTC3 (io) "LLWU_P7/UART1_RX/TPM0_CH2/CLKOUT", 49 PTC4 (io) "LLWU_P8/SPI0_PCS0/UART1_TX/TPM0_CH3", 50 PTC5 (io) "LLWU_P9/SPI0_SCK/LPTMR0_ALT2/CMP0_OUT", 51 PTC6 (io) "LLWU_P10/CMP0_IN0/SPI0_MOSI/EXTRG_IN/SPI0_MISO", 52 PTC7 (io) "CMP0_IN1/SPI0_MISO/SPI0_MOSI", 53 PTC8 (io) "CMP0_IN2/I2C0_SCL/TPM0_CH4", 54 PTC9 (io) "CMP0_IN3/I2C0_SDA/TPM0_CH5", 55 PTC10 (io) "I2C1_SCL", 56 PTC11 (io) "I2C1_SDA", 57 PTD0 (io) "SPI0_PCS0/TPM0_CH0", 58 PTD1 (io) "ADC0_SE5B/PTD1/SPI0_SCK/TPM0_CH1", 59 PTD2 (io) "SPI0_MOSI/UART2_RX/TPM0_CH2/SPI0_MISO", 60 PTD3 (io) "SPI0_MISO/UART2_TX/TPM0_CH3/SPI0_MOSI", 61 PTD4 (io) "LLWU_P14/SPI1_PCS0/UART2_RX/TPM0_CH4", 62 PTD5 (io) "ADC0_SE6B/SPI1_SCK/UART2_TX/TPM0_CH5", 63 PTD6 (io) "LLWU_P15/ADC0_SE7B/SPI1_MOSI/UART0_RX/SPI1_MISO", 64 PTD7 (io) "SPI1_MISO/UART0_TX/SPI1_MOSI"
part B pins: 3 VDD (power) "Digital supply voltage", 4 VSS (power), 7 VOUT33 (power), 8 VREGIN (power) "USB regulator input", 13 VDDA (power) "Analog supply voltage", 14 VREFH (power) "ADC reference  voltage high", 15 VREFL (power) "ADC reference  voltage low", 16 VSSA (power), 30 VDD (power) "Digital supply voltage", 31 VSS (power), 47 VSS (power), 48 VDD (power) "Digital supply voltage"

## CMP-020-00012-3
designator U?, comment STM32F401RBT6
ARM Cortex -M4 32b MCU+FPU, 256 KB Flash, 64 KB RAM, -40 to 85 degC, 64-Pin LQFP, RoHS, Tray; Manufacturer: STMicroelectronics; Frequency: 84MHz; Interface: USART; Power: 313mW; Max Supply Voltage: 3.6V; RAM Size: 64KB; I/Os: 50; Density: 128KB; Min Supply Voltage: 1.8V; Datasheet URL: http://www.st.com/st-web-ui/static/active/en/resource/technical/document/datasheet/DM00086815.pdf; Package Quantity: 160; Package Description: 64-Pin Low-profile Quad Flat Package, Body 10 x 10 mm, Pitch 0.5 mm; Packaging: Tray; Case/Package: LQFP; Pins: 64; Mounting Technology: SM; RoHS Compliant: True; Datasheet Version: Rev. 5, 08/2015; Manufacturer URL: http://www.st.com/; Package Reference: LQFP64
footprint STM-LQFP64_L (Thin QFP, 64-Leads, Body 10x10mm, Pitch 0.5mm, IPC High Density)
footprint STM-LQFP64_M (Thin QFP, 64-Leads, Body 10x10mm, Pitch 0.5mm, IPC Low Density)
footprint STM-LQFP64_N (Thin QFP, 64-Leads, Body 10x10mm, Pitch 0.5mm, IPC Medium Density)
part A pins: 2 PC13-ANTI_TAMP (io) "PC13-ANTI_TAMP/TAMP_1", 3 PC14-OSC32_IN (io) "PC14-OSC32_IN/OSC32_IN", 4 PC15-OSC32_OUT (io) "PC15-OSC32_OUT/OSC32_OUT", 5 PH0-OSC_IN (io) "PH0-OSC_IN/OSC_IN", 6 PH1-OSC_OUT (io) "PH1-OSC_OUT/OSC_OUT", 7 NRST (io), 8 PC0 (io) "PC0/ADC1_10", 9 PC1 (io) "PC1/ADC1_11", 10 PC2 (io) "PC2/SPI2_MISO,I2S2ext_SD/ADC1_12", 11 PC3 (io) "PC3/SPI2_MOSI/I2S2_SD/ADC1_13", 14 PA0-WKUP (io) "PA0-WKUP/USART2_CTS,TIM2_CH1/TIM2_ETR,TIM5_CH1/ADC1_0,WKUP", 15 PA1 (io) "PA1/USART2_RTS,TIM2_CH2,TIM5_CH2/ADC1_1", 16 PA2 (io) "PA2/USART2_TX,TIM2_CH3,TIM5_CH3,TIM9_CH1/ADC1_2", 17 PA3 (io) "PA3/USART2_RX,TIM2_CH4,TIM5_CH4,TIM9_CH2/ADC1_3", 20 PA4 (io) "PA4/SPI1_NSS,SPI3_NSS/I2S3_WS,USART2_CK/ADC1_4", 21 PA5 (io) "PA5/SPI1_SCK,TIM2_CH1/TIM2_ETR/ADC1_5", 22 PA6 (io) "PA6/SPI1_MISO,TIM1_BKIN,TIM3_CH1/ADC1_6", 23 PA7 (io) "PA7/SPI1_MOSI,TIM1_CH1N,TIM3_CH2/ADC1_7", 24 PC4 (io) "PC4/ADC1_14", 25 PC5 (io) "PC5/ADC1_15", 26 PB0 (io) "PB0/TIM1_CH2N,TIM3_CH3/ADC1_8", 27 PB1 (io) "PB1/TIM1_CH3N,TIM3_CH4/ADC1_9", 28 PB2 (io), 29 PB10 (io) "PB10/SPI2_SCK/I2S2_CK,I2C2_SCL,TIM2_CH3", 30 VCAP1 (power), 33 PB12 (io) "PB12/SPI2_NSS/I2S2_WS,I2C2_SMBAL,TIM1_BKIN", 34 PB13 (io) "PB13/SPI2_SCK/I2S2_CK,TIM1_CH1N", 35 PB14 (io) "PB14/SPI2_MISO,I2S2ext_SD,TIM1_CH2N", 36 PB15 (io) "PB15/SPI2_MOSI/I2S2_SD,TIM1_CH3N,RTC_50Hz", 37 PC6 (io) "PC6/I2S2_MCK,USART6_TX,TIM3_CH1,SDIO_D6", 38 PC7 (io) "PC7/I2S3_MCK,USART6_RX,TIM3_CH2,SDIO_D7", 39 PC8 (io) "PC8/USART6_CK,TIM3_CH3,SDIO_D0", 40 PC9 (io) "PC9/I2S2_CKIN,I2C3_SDA,TIM3_CH4,SDIO_D1,MCO_2", 41 PA8 (io) "PA8/I2C3_SCL,USART1_CK,TIM1_CH1,USB_FS_SOF,MCO_1", 42 PA9 (io) "PA9/I2C3_SMBAL,USART1_TX,TIM1_CH2,USB_FS_VBUS", 43 PA10 (io) "PA10/USART1_RX,TIM1_CH3,USB_FS_ID", 44 PA11 (io) "PA11/USART1_CTS,USART6_TX,TIM1_CH4,USB_FS_DM", 45 PA12 (io) "PA12/USART1_RTS,USART6_RX,TIM1_ETR,USB_FS_DP", 46 PA13 (io) "PA13/JTMS-SWDIO", 49 PA14 (io) "PA14/JTCK-SWCLK", 50 PA15 (io) "PA15/SPI1_NSS,SPI3_NSS/I2S3_WS,TIM2_CH1/TIM2_ETR,JTDI", 51 PC10 (io) "PC10/SPI3_SCK/I2S3_CK,SDIO_D2", 52 PC11 (io) "PC11/I2S3ext_SD,SPI3_MISO,SDIO_D3", 53 PC12 (io) "PC12/SPI3_MOSI/I2S3_SD,SDIO_CK", 54 PD2 (io) "PD2/TIM3_ETR,SDIO_CMD", 55 PB3 (io) "PB3/SPI1_SCK,SPI3_SCK/I2S3_CK,I2C2_SDA,TIM2_CH2,JTDO-SWO", 56 PB4 (io) "PB4/SPI1_MISO,SPI3_MISO,I2S3ext_SD,I2C3_SDA,TIM3_CH1,JTRST", 57 PB5 (io) "PB5/SPI1_MOSI,SPI3_MOSI/I2S3_SD,I2C1_SMBAL,TIM3_CH2", 58 PB6 (io) "PB6/I2C1_SCL,USART1_TX,TIM4_CH1", 59 PB7 (io) "PB7/I2C1_SDA,USART1_RX,TIM4_CH2", 60 BOOT0 (in), 61 PB8 (io) "PB8/I2C1_SCL,TIM4_CH3,TIM10_CH1,SDIO_D4", 62 PB9 (io) "PB9/SPI2_NSS/I2S2_WS,I2C1_SDA,TIM4_CH4,TIM11_CH1,SDIO_D5"
part B pins: 1 VBAT (power), 12 VSSA/VREF- (power), 13 VDDA/VREF+ (power), 18 VSS (power), 19 VDD (power), 31 VSS (power), 32 VDD (power), 47 VSS (power), 48 VDD (power), 63 VSS (power), 64 VDD (power)

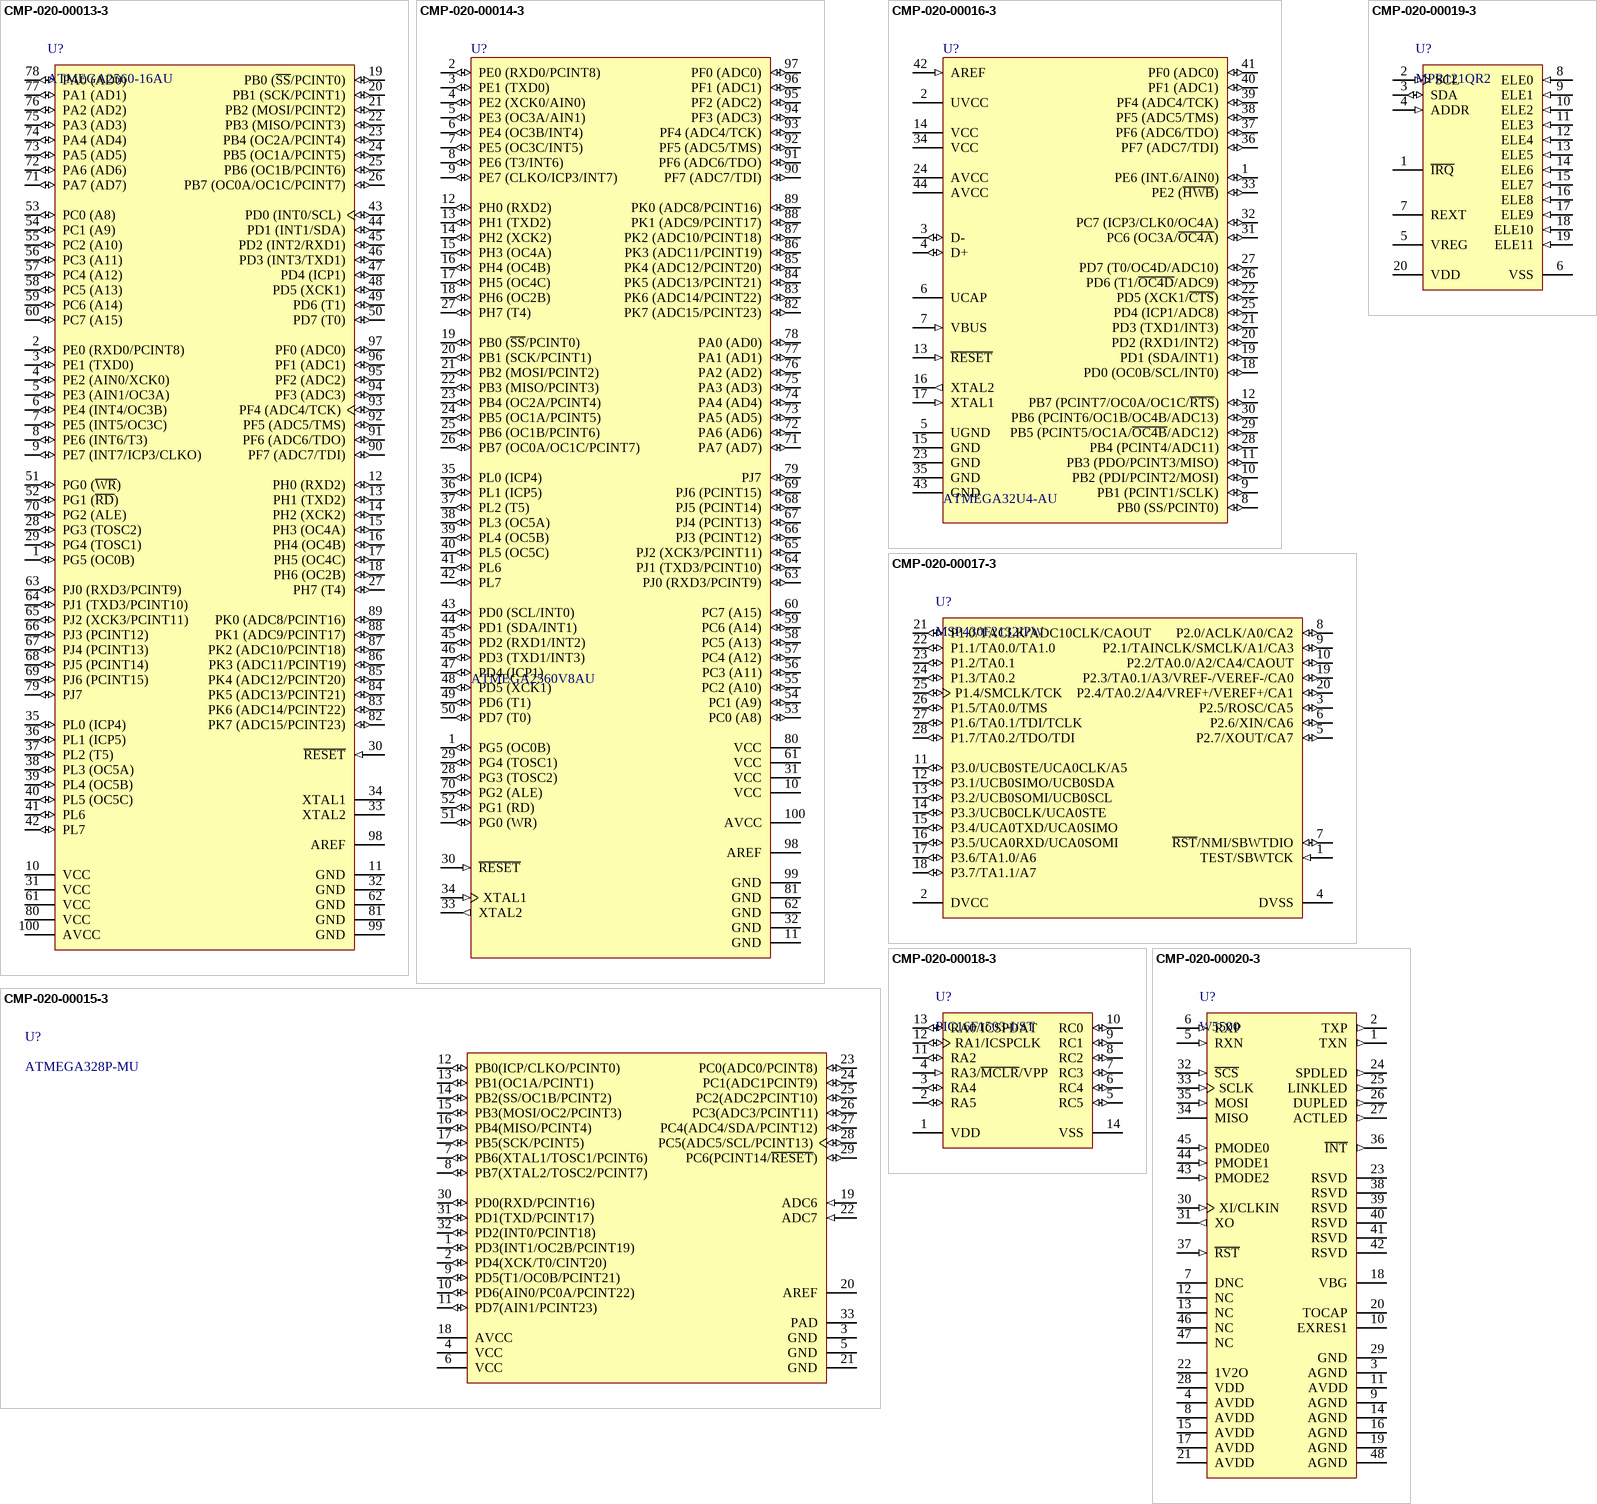
[diagram p23: symbols CMP-020-00013-3 to CMP-020-00020-3]